# Altium footprint library mmyLibrary.PcbLib: 231 footprints (part 5 of 15)
Each footprint in its own frame and in the unit in brackets; x right, y up, seen from the top. Pads: shape width x height; smd on the part's side, far side on the other; paste and mask are expansions set on the pad; w line width, h text height; cw(c..) or ccw(c..) is an arc to the next point about the centre after c.
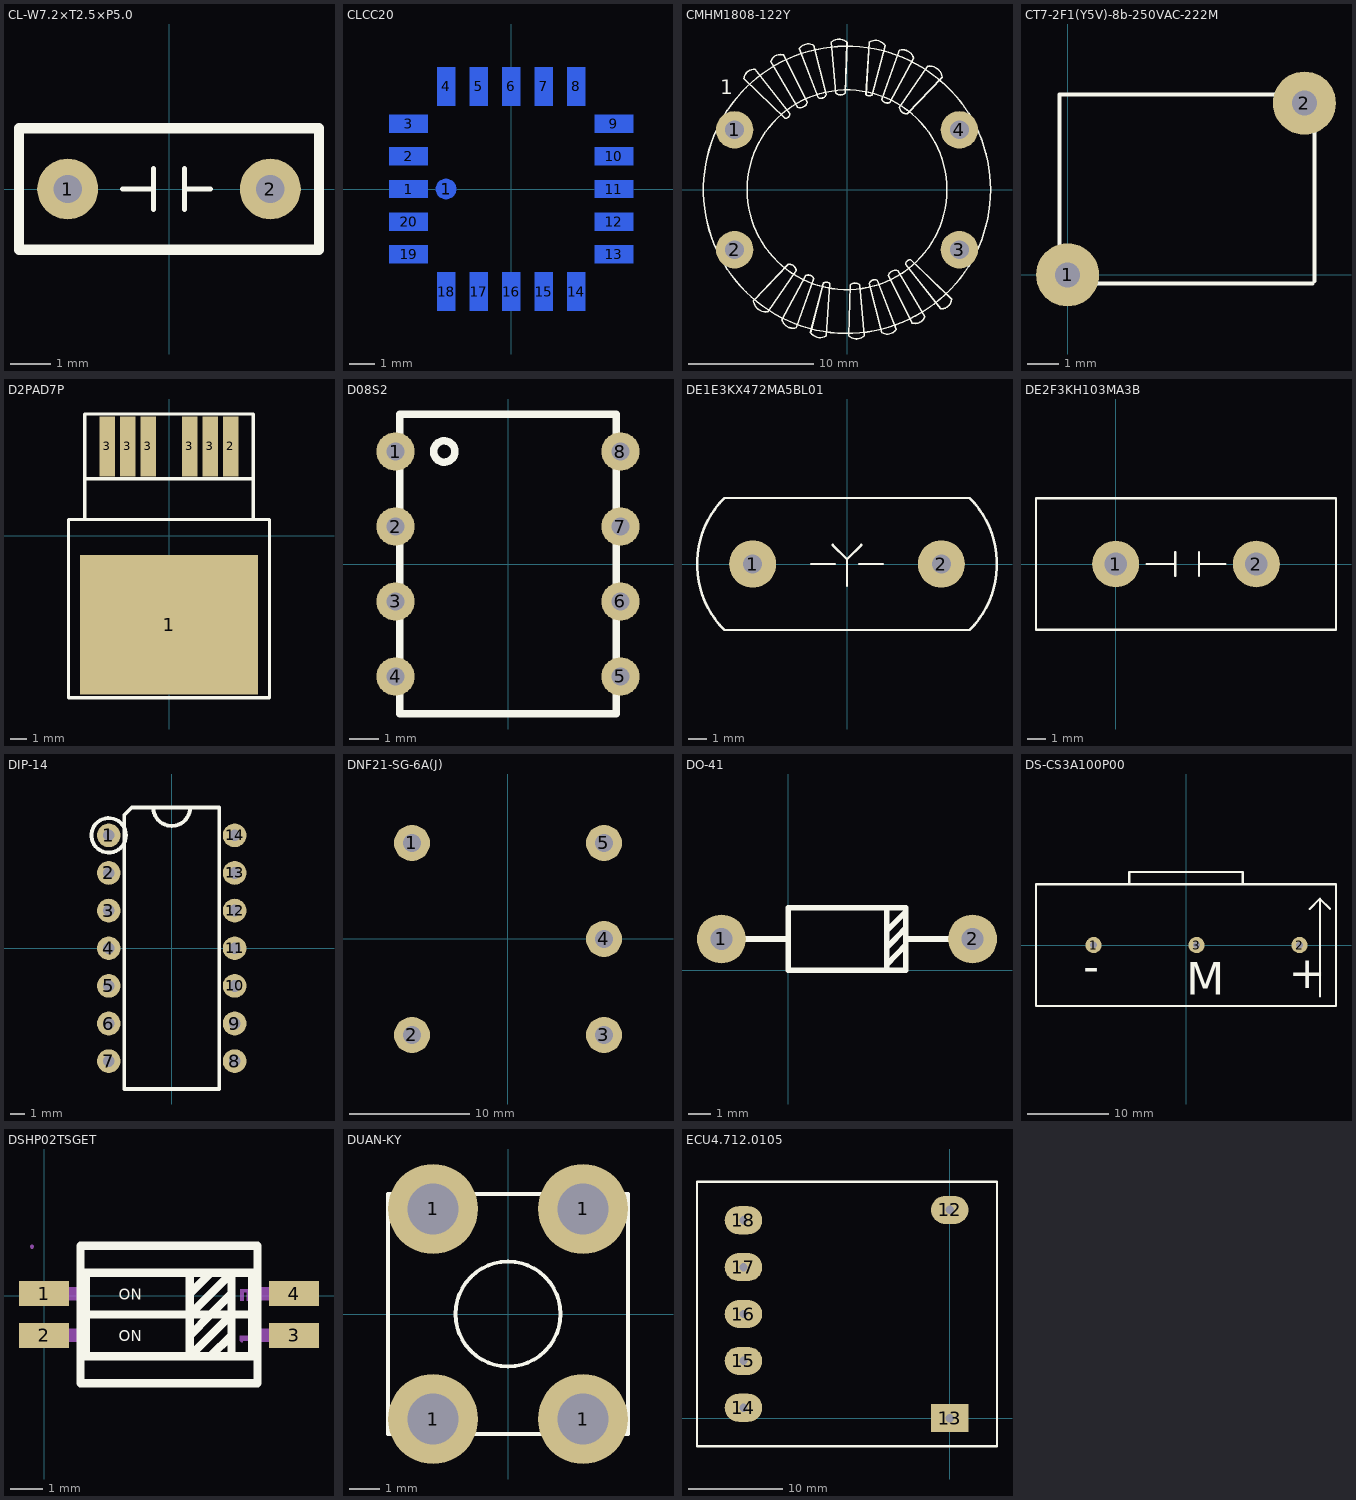
[diagram p4: the footprints below, top view; thin cyan lines are the x and y axes]

## CL-W7.2×T2.5×P5.0 [mm]
pads (2):
  round 1.5 hole 0.7: 1(-2.5,0) 2(2.5,0)
Top Overlay:
  lines w0.127: -1.143,0 -0.381,0 ; -0.381,-0.508 -0.381,0.508 ; 0.381,-0.508 0.381,0.508 ; 0.381,0 1.016,0
  lines w0.254: -3.7,-1.5 -3.7,1.5 3.7,1.5 3.7,-1.5 -3.7,-1.5

## CLCC20 [mm]
pads (21):
  rect 1.5x0.7 smd far side: 1(-4,0) 2(-4,1.27) 3(-4,2.54) 9(4,2.54) 10(4,1.27) 11(4,0) 12(4,-1.27) 13(4,-2.54) 19(-4,-2.54) 20(-4,-1.27)
  round 0.8 smd far side: 1(-2.54,0)
  rect 0.7x1.5 smd far side: 4(-2.54,4) 5(-1.27,4) 6(0,4) 7(1.27,4) 8(2.54,4) 14(2.54,-4) 15(1.27,-4) 16(0,-4) 17(-1.27,-4) 18(-2.54,-4)
Bottom Overlay:
  circle w0.254: c-5.387,0 r0.18
  lines w0.254: -5.969,-5.715 -5.969,5.715 5.715,5.715 5.715,-5.715 -5.969,-5.715

## CMHM1808-122Y [mm]
pads (4):
  round 3 hole 1.5: 1(-9,4.8) 2(-9,-4.8) 3(9,-4.8) 4(9,4.8)
Top Overlay:
  circle w0.127: c0,0 r8
  circle w0.127: c0,0 r11.5
  lines w0.127: -8.255,8.89 cw(c-7.429,8.826) -7.366,9.652 -4.572,6.096 cw(c-4.953,6.096) -4.953,5.715 -8.255,8.89 ; -7.493,-8.89 ccw(c-6.477,-8.763) -6.35,-9.779 -4.064,-6.477 ccw(c-4.636,-6.54) -4.699,-5.969 -7.493,-8.89 ; -6.096,10.287 cw(c-5.334,10.033) -5.08,10.795 -3.175,6.985 cw(c-3.746,7.175) -3.937,6.604 -6.096,10.287 ; -5.207,-10.414 ccw(c-4.318,-10.16) -4.064,-11.049 -2.667,-7.112 ccw(c-3.111,-7.302) -3.302,-6.858 -5.207,-10.414 ; -3.81,11.303 cw(c-3.111,10.858) -2.667,11.557 -1.651,7.62 cw(c-2.096,7.81) -2.286,7.366 -3.81,11.303 ; -2.921,-11.43 ccw(c-2.159,-10.922) -1.651,-11.684 -1.397,-7.493 ccw(c-1.651,-7.747) -1.905,-7.493 -2.921,-11.43 ; -1.27,11.811 cw(c-0.635,11.176) 0,11.811 -0.127,7.747 cw(c-0.508,8.128) -0.889,7.747 -1.27,11.811 ; 0.127,-11.684 ccw(c0.762,-11.049) 1.397,-11.684 1.016,-7.62 ccw(c0.635,-8.001) 0.254,-7.62 0.127,-11.684 ; 1.524,7.62 ccw(c1.778,7.874) 2.032,7.62 3.048,11.557 ccw(c2.286,11.049) 1.778,11.811 1.524,7.62 ; 1.778,-7.493 cw(c2.223,-7.683) 2.413,-7.239 3.937,-11.176 cw(c3.238,-10.731) 2.794,-11.43 1.778,-7.493 ; 2.794,7.239 ccw(c3.238,7.429) 3.429,6.985 5.334,10.541 ccw(c4.445,10.287) 4.191,11.176 2.794,7.239 ; 3.302,-6.858 cw(c3.873,-7.048) 4.064,-6.477 6.223,-10.16 cw(c5.461,-9.906) 5.207,-10.668 3.302,-6.858 ; 4.191,6.604 ccw(c4.763,6.667) 4.826,6.096 7.62,9.017 ccw(c6.604,8.89) 6.477,9.906 4.191,6.604 ; 4.699,-5.969 cw(c5.08,-5.969) 5.08,-5.588 8.382,-8.763 cw(c7.556,-8.7) 7.493,-9.525 4.699,-5.969
  text "1" at -10.16,7.239 h2

## CT7-2F1(Y5V)-8b-250VAC-222M [mm]
pads (2):
  round 2 hole 0.8: 1(0,0) 2(7.5,5.44)
Top Overlay:
  lines w0.127: 7.75,-0.28 -0.25,-0.28 -0.25,5.72 7.75,5.72 ; 7.814,-0.201 7.814,5.799

## D2PAD7P [mm] "(英飞凌)"
pads (7):
  rect 11x8.6 smd: 1(0,-5.5)
  rect 0.95x3.7 smd: 2(3.81,5.5) 3(-3.81,5.5) 3(-2.54,5.5) 3(-1.27,5.5) 3(1.27,5.5) 3(2.54,5.5)
Top Overlay:
  lines w0.2: -5.2,3.5 5.2,3.5 ; -5.2,1 -6.2,1 -6.2,-10 6.2,-10 6.2,1 5.2,1 ; -5.2,1 5.2,1 ; -5.2,1 -5.2,7.5 5.2,7.5 5.2,1

## D08S2 [mm]
pads (8):
  round 1.3 hole 0.6: 1(-3.81,3.81) 2(-3.81,1.27) 3(-3.81,-1.27) 4(-3.81,-3.81) 5(3.81,-3.81) 6(3.81,-1.27) 7(3.81,1.27) 8(3.81,3.81)
Top Overlay:
  circle w0.254: c-2.159,3.81 r0.359
  lines w0.254: -3.66,5.057 -3.66,-5.08 3.66,-5.08 3.66,5.08 -3.66,5.08

## DE1E3KX472MA5BL01 [mm] "12*7"
pads (2):
  round 2.5 hole 1: 1(-5,0) 2(5,0)
Top Overlay:
  lines w0.127: -1.905,0 -0.635,0 ; -0.762,1.016 0,0.254 ; 0,-1.143 0,0.254 ; 0.635,0 1.905,0 ; 0.762,1.016 0,0.254 ; -6.5,-3.5 cw(c-3,0) -6.5,3.5 6.5,3.5 cw(c3,0) 6.5,-3.5 -6.5,-3.5

## DE2F3KH103MA3B [mm]
pads (2):
  round 2.5 hole 1.2: 1(0,0) 2(7.5,0)
Top Overlay:
  lines w0.127: 1.651,0 2.54,0 3.175,0 ; 3.175,-0.635 3.175,0.635 ; 4.445,-0.635 4.445,0.635 ; 4.445,0 5.842,0 ; -4.25,-3.5 -4.25,3.5 11.75,3.5 11.75,-3.5 -4.25,-3.5

## DIP-14 [mm]
pads (14):
  round 1.6 hole 0.8: 1(-4.25,7.62) 2(-4.25,5.08) 3(-4.25,2.54) 4(-4.25,0) 5(-4.25,-2.54) 6(-4.25,-5.08) 7(-4.25,-7.62) 8(4.25,-7.62) 9(4.25,-5.08) 10(4.25,-2.54) 11(4.25,0) 12(4.25,2.54) 13(4.25,5.08) 14(4.25,7.62)
Top Overlay:
  circle w0.254: c-4.25,7.62 r1.166
  lines w0.254: -1.245,9.5 ccw(c0,9.5) 1.245,9.5 cw(c0,9.5) 0,8.255 ; -3.2,-9.5 -3.2,8.992 -2.692,9.5 3.2,9.5 3.2,-9.5 -3.2,-9.5

## DNF21-SG-6A(J) [mm]
pads (5):
  round 3 hole 1.5: 1(-8,8) 2(-8,-8) 3(8,-8) 4(8,0) 5(8,8)
Bottom Overlay:
  lines w0.254: -12.5,-11.5 ccw(c-11.5,-11.5) -11.5,-12.5 11.5,-12.5 ccw(c11.5,-11.5) 12.5,-11.5 12.5,11.5 ccw(c11.5,11.5) 11.5,12.5 -11.5,12.5 ccw(c-11.5,11.5) -12.5,11.5 -12.5,-11.5
  text "Lin" at -5.7,-7.3 h1.5
  text "Nin" at -5.7,8.7 h1.5
  text "Lout" at 1.8,-7.2 h1.5
  text "GND" at 2.1,0.8 h1.5
  text "Nout" at 1.4,8.8 h1.5

## DO-41 [mm]
pads (2):
  round 2.2 hole 1: 1(-3,1.4) 2(8.3,1.4)
Top Overlay:
  lines w0.254: -3,1.4 0,1.4 ; 4.445,0 4.445,2.667 ; 4.445,0.254 5.3,1.143 ; 4.445,1.016 5.3,1.905 ; 4.445,1.778 5.207,2.54 ; 5.3,1.397 8.297,1.397 ; 0,0 5.3,0 5.3,2.8 0,2.8 0,0

## DO-219AB(SMF) [mm]

## DS-CS3A100P00 [mm]
pads (3):
  round 2 hole 0.9: 1(-11.4,0) 2(14,0) 3(1.3,0)
Top Overlay:
  lines w0.254: -7,7.515 -7,9 7,9 7,7.508 ; 15.24,4.445 16.51,5.715 ; 16.51,-6.35 16.51,5.715 ; 17.78,4.445 16.51,5.715 ; -18.5,-7.5 18.5,-7.5 18.5,7.5 -18.5,7.5 -18.5,-7.5
  text "M" at 0,-6.096 h4
  text "+" at 12.7,-5.334 h4
  text "-" at -12.7,-4.572 h4

## DSHP02TSGET [mil]
pads (4):
  rect 60x30 smd mask+2: 1(0,2.68) 2(0,-47.32) 3(300,-47.32) 4(300,2.68)
Top Overlay:
  lines w10: 175,-47.32 200,-22.32 225,2.68 ; 175,2.68 200,27.68 ; 175,27.68 175,-22.32 ; 200,-72.32 225,-47.32 ; 225,-72.32 225,-22.32 ; 50,-22.32 50,-72.32 250,-72.32 250,-22.32 ; 50,-22.32 250,-22.32 ; 50,-22.32 50,27.68 250,27.68 250,-22.32 ; 50,-22.32 250,-22.32 ; 175,-22.32 225,27.68 225,-22.32 ; 175,-22.32 175,-72.32 225,-22.32 ; 43.7,-105 256.3,-105 256.3,60.35 43.7,60.35 43.7,-105
  text "ON" at 89.46,-4.53 h12.98
  text "ON" at 89.46,-54.53 h12.98
Mechanical 6:
  region: 257.28,-1.65 257.28,-5.59 243.5,-5.59 243.5,4.25 239.57,4.25 239.57,-5.59 235.63,-5.59 235.63,8.19 247.44,8.19 247.44,-1.65 253.35,-1.65 253.35,8.19 257.28,8.19 257.28,-1.65
  region: 234.65,-51.85 234.65,-53.82 236.61,-55.79 238.58,-55.79 238.58,-53.82 256.3,-53.82 256.3,-47.91 234.65,-47.91
Mechanical 15:
  region: 19.09,-55.2 -14.37,-55.2 -14.37,-39.45 19.09,-39.45
  region: 44.09,-55.2 18.7,-55.2 18.7,-39.45 44.09,-39.45
  region: 314.37,-55.2 280.9,-55.2 280.9,-39.45 314.37,-39.45
  region: 281.3,-55.2 255.91,-55.2 255.91,-39.45 281.3,-39.45
  region: 314.37,-5.2 280.9,-5.2 280.9,10.55 314.37,10.55
  region: 281.3,-5.2 255.91,-5.2 255.91,10.55 281.3,10.55
  region: 19.09,-5.2 -14.37,-5.2 -14.37,10.55 19.09,10.55
  region: 44.09,-5.2 18.7,-5.2 18.7,10.55 44.09,10.55
  region: -14.37,61.53 -15.35,61.53 -16.73,60.15 -16.73,58.19 -15.35,56.81 -14.37,56.81 -13.39,56.81 -12.01,58.19 -12.01,60.15 -13.39,61.53
  lines w2: 43.7,-103.82 43.7,59.17 256.3,59.17 256.3,-103.82 43.7,-103.82

## DUAN-KY [mm]
pads (4):
  round 3 hole 1.7: 1(-2.5,-3.5) 1(-2.5,3.5) 1(2.5,-3.5) 1(2.5,3.5)
Top Overlay:
  circle w0.127: c0,0 r1.75
  lines w0.127: -4,-4 4,-4 4,4 -4,4 -4,-4

## ECU4.712.0105 [mm]
pads (7):
  oval 4x3 hole 0.9: 12(0,22.2) 14(-22,1.1) 15(-22,6.1) 16(-22,11.1) 17(-22,16.1) 18(-22,21.1)
  rect 4x3 hole 0.9: 13(0,0)
Top Overlay:
  lines w0.254: 0,-3 -10.96,-3 ; -10.96,-3 5.04,-3 5.04,25.195 5.036,25.2 0,25.2 -26.955,25.2 -26.96,25.195 -26.96,-3 -10.96,-3